# Altium footprint library LukaLIBRARY.PcbLib: 772 footprints (part 4 of 49)
Each footprint in its own frame and in the unit in brackets; x right, y up, seen from the top. Pads: shape width x height; smd on the part's side, far side on the other; paste and mask are expansions set on the pad; w line width, h text height; cw(c..) or ccw(c..) is an arc to the next point about the centre after c.
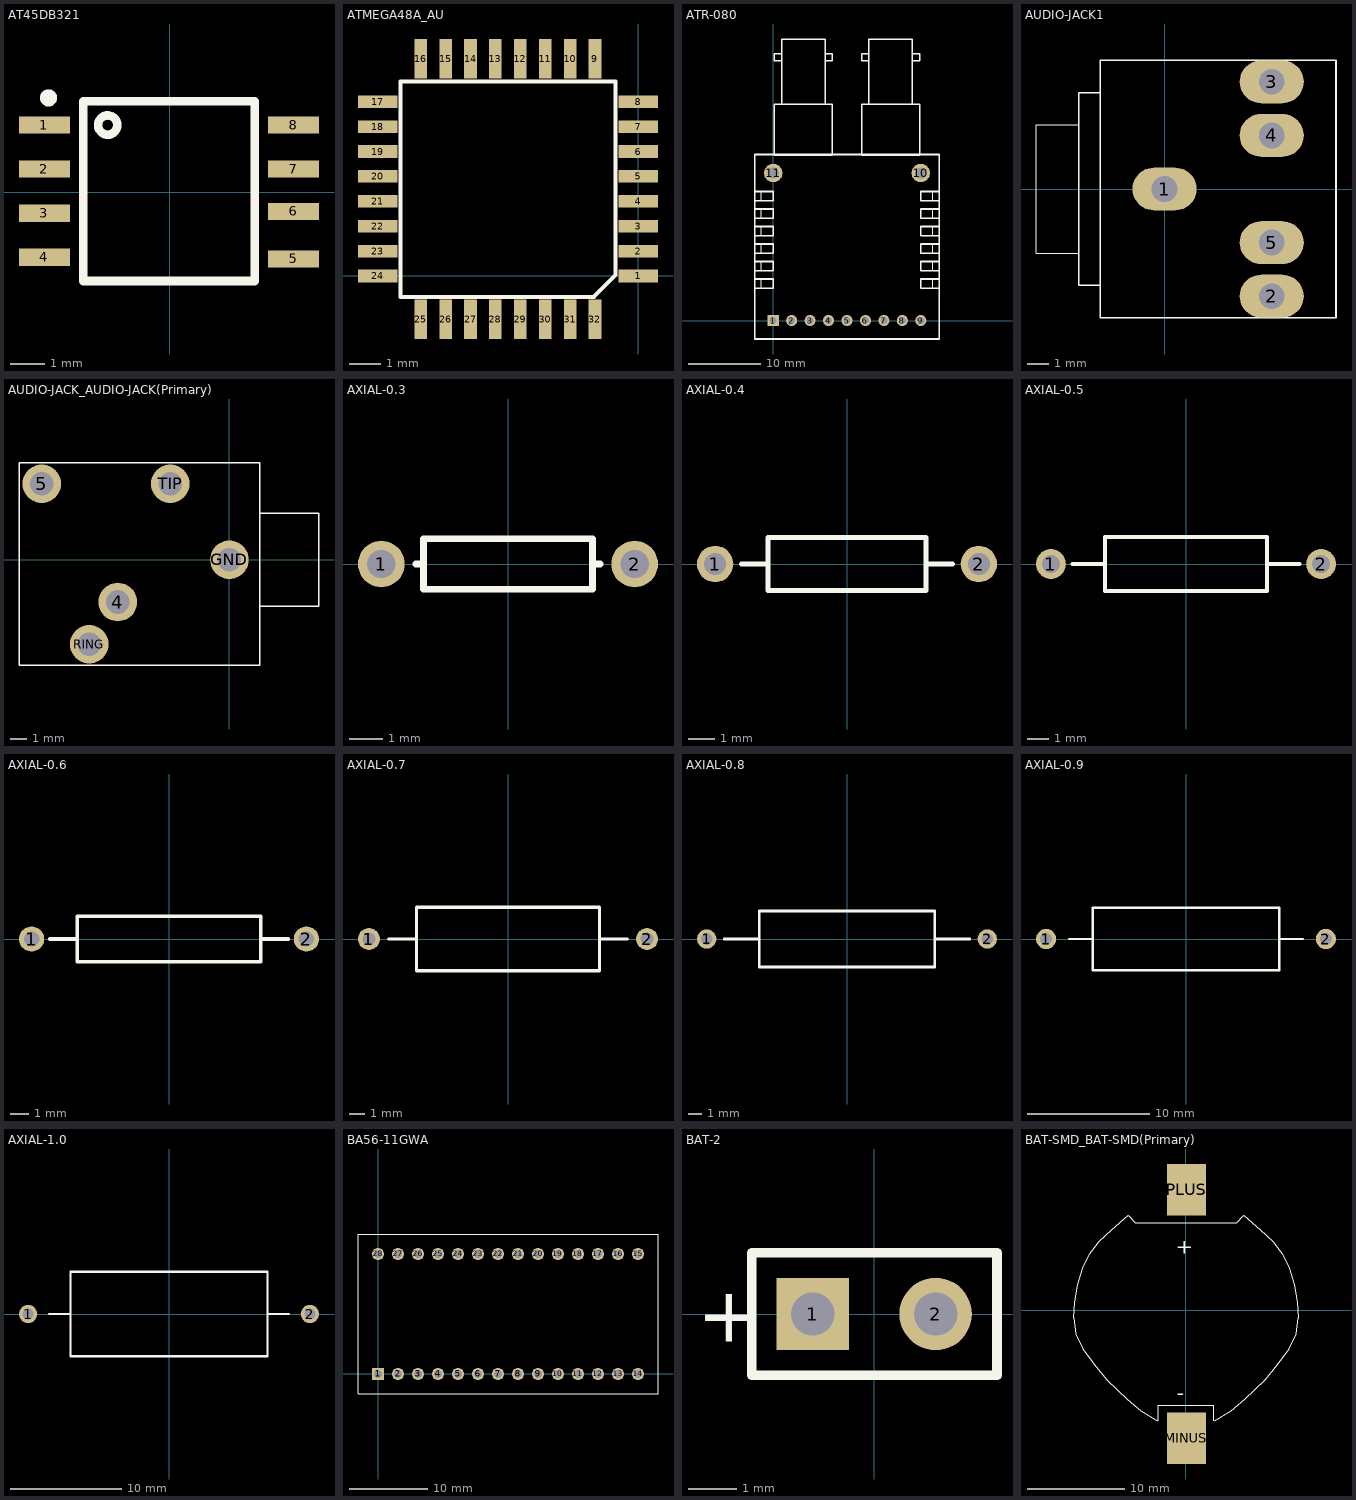
[diagram p3: the footprints below, top view; thin cyan lines are the x and y axes]

## AT45DB321 [mm] "SPI Flash SOIC 8"
pads (8):
  rect 1.5x0.508 smd: 1(-3.7,1.975) 2(-3.7,0.675) 3(-3.7,-0.625) 4(-3.7,-1.925) 5(3.65,-1.975) 6(3.65,-0.575) 7(3.65,0.675) 8(3.65,1.975)
Top Overlay:
  circle w0.254: c-3.577,2.775 r0.127
  circle w0.254: c-1.834,1.975 r0.284
  lines w0.254: -2.55,-2.625 2.5,-2.625 2.5,2.675 -2.55,2.675 -2.55,-2.625

## ATMEGA48A_AU [mm]
pads (32):
  rect 1.27x0.406 smd: 1(0,0) 2(0,0.8) 3(0,1.6) 4(0,2.4) 5(0,3.2) 6(0,4) 7(0,4.8) 8(0,5.6) 17(-8.37,5.6) 18(-8.37,4.8) 19(-8.37,4) 20(-8.37,3.2) 21(-8.37,2.4) 22(-8.37,1.6) 23(-8.37,0.8) 24(-8.37,0)
  rect 0.406x1.27 smd: 9(-1.391,6.98) 10(-2.19,6.98) 11(-2.99,6.98) 12(-3.79,6.98) 13(-4.59,6.98) 14(-5.39,6.98) 15(-6.19,6.98) 16(-6.99,6.98) 25(-6.99,-1.39) 26(-6.19,-1.39) 27(-5.39,-1.39) 28(-4.59,-1.39) 29(-3.79,-1.39) 30(-2.99,-1.39) 31(-2.19,-1.39) 32(-1.391,-1.387)
Top Overlay:
  lines w0.127: -7.641,-0.665 -7.64,6.25 ; -7.641,6.251 -0.73,6.25 -0.73,0.03 -1.427,-0.665 ; -7.64,-0.67 -1.42,-0.67

## ATR-080 [mil]
pads (11):
  rect 60x60 hole 38 mask-1000: 1(0,0)
  round 60 hole 38 mask-1000: 2(100,0) 3(200,0) 4(300,0) 5(400,0) 6(500,0) 7(600,0) 8(700,0) 9(800,0)
  round 100 hole 60: 10(800,800) 11(0,800)
Top Overlay:
  lines w1: -65,175 -65,225 ; -65,270 -65,320 ; -65,365 -65,415 ; -65,460 -65,510 ; -65,555 -65,605 ; -65,650 -65,700 ; 865,175 865,225 ; 865,270 865,320 ; 865,365 865,415 ; 865,460 865,510 ; 865,555 865,605 ; 865,650 865,700
  lines w7.87: 45.67,1172.44 45.67,1526.77 281.89,1526.77 281.89,1172.44 ; 45.67,1408.66 6.3,1408.66 6.3,1448.03 45.67,1448.03 ; 281.89,1408.66 321.26,1408.66 321.26,1448.03 281.89,1448.03 ; 518.11,1172.44 518.11,1526.77 754.33,1526.77 754.33,1172.44 ; 518.11,1408.66 478.74,1408.66 478.74,1448.03 518.11,1448.03 ; 754.33,1408.66 793.7,1408.66 793.7,1448.03 754.33,1448.03 ; 6.3,896.85 321.26,896.85 321.26,1172.44 6.3,1172.44 6.3,896.85 ; 478.74,896.85 793.7,896.85 793.7,1172.44 478.74,1172.44 478.74,896.85
  lines w10: -100,175 0,175 0,225 -100,225 ; -100,270 0,270 0,320 -100,320 ; -100,365 0,365 0,415 -100,415 ; -100,460 0,460 0,510 -100,510 ; -100,555 0,555 0,605 -100,605 ; -100,650 0,650 0,700 -100,700 ; -100,900 900,900 ; -100,900.79 -100,-100 900,-100 900,900.79 ; 900,175 800,175 800,225 900,225 ; 900,270 800,270 800,320 900,320 ; 900,365 800,365 800,415 900,415 ; 900,460 800,460 800,510 900,510 ; 900,555 800,555 800,605 900,605 ; 900,650 800,650 800,700 900,700
Top Solder:
  drawing of 9 lines, arcs and shapes, not listed
Bottom Solder:
  drawing of 9 lines, arcs and shapes, not listed

## AUDIO-JACK1 [mm]
pads (5):
  oval 3x2 hole 1.2: 1(0,0) 2(5,-5) 3(5,5) 4(5,2.5) 5(5,-2.5)
Top Overlay:
  lines w0.03: -4,-3 -6,-3 -6,3 -4,3
  lines w0.076: -3,-4.5 -4,-4.5 -4,0 -4,4.5 -3,4.5 ; -3,-6 -3,0 -3,6 8,6 8,-6 -3,-6

## AUDIO-JACK_AUDIO-JACK(Primary) [mil]
pads (5):
  round 90 hole 55: 4(-259.84,-98.43) 5(-437.01,177.17) GND(0,0) RING(-326.77,-196.85) TIP(-137.8,177.17)
Top Overlay:
  lines w3: 70.87,-108.27 208.66,-108.27 208.66,108.27 70.87,108.27 ; -490.16,-246.06 -490.16,226.38 70.87,226.38 70.87,-246.06 -490.16,-246.06

## AXIAL-0.3 [mm] "Axial Device, Thru-Hole; 2 Leads; 0.3 in Pin Spacing"
height 1.524
pads (2):
  round 1.4 hole 0.85: 1(-3.81,0) 2(3.81,0)
Top Overlay:
  lines w0.2: -2.769,0 -2.54,0 ; 2.769,0 2.54,0 ; 2.54,0 2.54,0.762 -2.54,0.762 -2.54,-0.762 2.54,-0.762 2.54,0

## AXIAL-0.4 [mm] "Axial Device, Thru-Hole; 2 Leads; 0.4 in Pin Spacing"
height 2.032
pads (2):
  round 1.4 hole 0.85: 1(-5.08,0) 2(5.08,0)
Top Overlay:
  lines w0.2: -4.064,0 -3.048,0 ; 3.048,0 4.064,0 ; -3.048,-1.016 3.048,-1.016 3.048,1.016 -3.048,1.016 -3.048,-1.016

## AXIAL-0.5 [mm] "Axial Device, Thru-Hole; 2 Leads; 0.5 in Pin Spacing"
height 2.54
pads (2):
  round 1.4 hole 0.85: 1(-6.35,0) 2(6.35,0)
Top Overlay:
  lines w0.2: -5.334,0 -3.81,0 ; 3.81,0 5.334,0 ; -3.81,-1.27 -3.81,1.27 3.81,1.27 3.81,-1.27 -3.81,-1.27

## AXIAL-0.6 [mm] "Axial Device, Thru-Hole; 2 Leads; 0.6 in Pin Spacing"
height 2.54
pads (2):
  round 1.4 hole 0.85: 1(-7.62,0) 2(7.62,0)
Top Overlay:
  lines w0.2: -6.604,0 -5.08,0 ; 5.08,0 6.604,0 ; -5.08,-1.27 -5.08,1.27 5.08,1.27 5.08,-1.27 -5.08,-1.27

## AXIAL-0.7 [mm] "Axial Device, Thru-Hole; 2 Leads; 0.7 in Pin Spacing"
height 4.064
pads (2):
  round 1.4 hole 0.85: 1(-8.89,0) 2(8.89,0)
Top Overlay:
  lines w0.2: -7.62,0 -5.842,0 ; 5.842,0 7.62,0 ; -5.842,-2.032 5.842,-2.032 5.842,2.032 -5.842,2.032 -5.842,-2.032

## AXIAL-0.8 [mm] "Axial Device, Thru-Hole; 2 Leads; 0.8 in Pin Spacing"
height 4.064
pads (2):
  round 1.4 hole 0.85: 1(-10.16,0) 2(10.16,0)
Top Overlay:
  lines w0.2: -8.89,0 -6.35,0 ; 6.35,0 8.89,0 ; -6.35,-2.032 -6.35,2.032 6.35,2.032 6.35,-2.032 -6.35,-2.032

## AXIAL-0.9 [mm] "Axial Device, Thru-Hole; 2 Leads; 0.9 in Pin Spacing"
height 5.08
pads (2):
  round 1.65 hole 1: 1(-11.43,0) 2(11.43,0)
Top Overlay:
  lines w0.2: -9.525,0 -7.62,0 ; 7.62,0 9.525,0 ; -7.62,-2.54 7.62,-2.54 7.62,2.54 -7.62,2.54 -7.62,-2.54

## AXIAL-1.0 [mm] "Axial Device, Thru-Hole; 2 Leads; 1.0 in Pin Spacing"
height 7.62
pads (2):
  round 1.65 hole 1: 1(-12.7,0) 2(12.7,0)
Top Overlay:
  lines w0.2: -10.795,0 -8.89,0 ; 8.89,0 10.795,0 ; -8.89,-3.81 -8.89,3.81 8.89,3.81 8.89,-3.81 -8.89,-3.81

## BA56-11GWA [mil]
pads (28):
  rect 60x60 hole 38 mask-1000: 1(0,0)
  round 60 hole 38 mask-1000: 2(100,0) 3(200,0) 4(300,0) 5(400,0) 6(500,0) 7(600,0) 8(700,0) 9(800,0) 10(900,0) 11(1000,0) 12(1100,0) 13(1200,0) 14(1300,0) 15(1300,600) 16(1200,600) 17(1100,600) 18(1000,600) 19(900,600) 20(800,600) 21(700,600) 22(600,600) 23(500,600) 24(400,600) 25(300,600) 26(200,600) 27(100,600) 28(0,600)
Top Overlay:
  lines w3: -100,0 -100,-100 ; -100,600 -100,700 ; -100,-100 1400,-100 1400,700 -100,700 ; -100,-100 -100,700
Top Solder:
  drawing of 28 lines, arcs and shapes, not listed
Bottom Solder:
  drawing of 28 lines, arcs and shapes, not listed

## BAT-2 [mm] "Battery; 2 Leads"
pads (2):
  rect 1.5x1.5 hole 0.9: 1(-1.27,0)
  round 1.5 hole 0.9: 2(1.27,0)
Top Overlay:
  lines w0.2: -2.54,-1.27 -2.54,1.27 2.54,1.27 2.54,-1.27 -2.54,-1.27
  text "+" at -3.67,-0.577 h1.15

## BAT-SMD_BAT-SMD(Primary) [mm]
pads (2):
  rect 4.064x5.334 smd mask-25.4: MINUS(0.1,-13.2) PLUS(0.1,12.4)
Top Overlay:
  lines w0.1: -2.9,-11.4 -4.6,-10.4 -6,-9.2 -8.1,-7.2 -9.4,-5.6 -10.6,-4 -11.3,-2.5 -11.5,-0.8 -11.4,0.8 -11.1,2.6 -10.6,4.3 -9.9,5.8 -8.9,7.1 -7.6,8.3 -5.9,9.8 -5.2,9 0.1,9 ; -2.8,-11.4 -2.8,-9.8 0.1,-9.8 ; 0,-9.8 2.9,-9.8 2.9,-11.4 ; 0,9 5.3,9 6,9.8 7.7,8.3 9,7.1 10,5.8 10.7,4.3 11.2,2.6 11.5,0.8 11.6,-0.8 11.4,-2.5 10.7,-4 9.5,-5.6 8.2,-7.2 6.1,-9.2 4.7,-10.4 3,-11.4
  text "-" at -0.9,-9.3 h1.59
  text "+" at -1,5.8 h1.59
Top Solder:
  region: 2.132,15.067 -1.932,15.067 -1.932,9.733 2.132,9.733
  region: 2.132,-10.533 -1.932,-10.533 -1.932,-15.867 2.132,-15.867